# Altium footprint library idc.PcbLib: 45 footprints (part 3 of 3)
Each footprint in its own frame and in the unit in brackets; x right, y up, seen from the top. Pads: shape width x height; smd on the part's side, far side on the other; paste and mask are expansions set on the pad; w line width, h text height; cw(c..) or ccw(c..) is an arc to the next point about the centre after c.
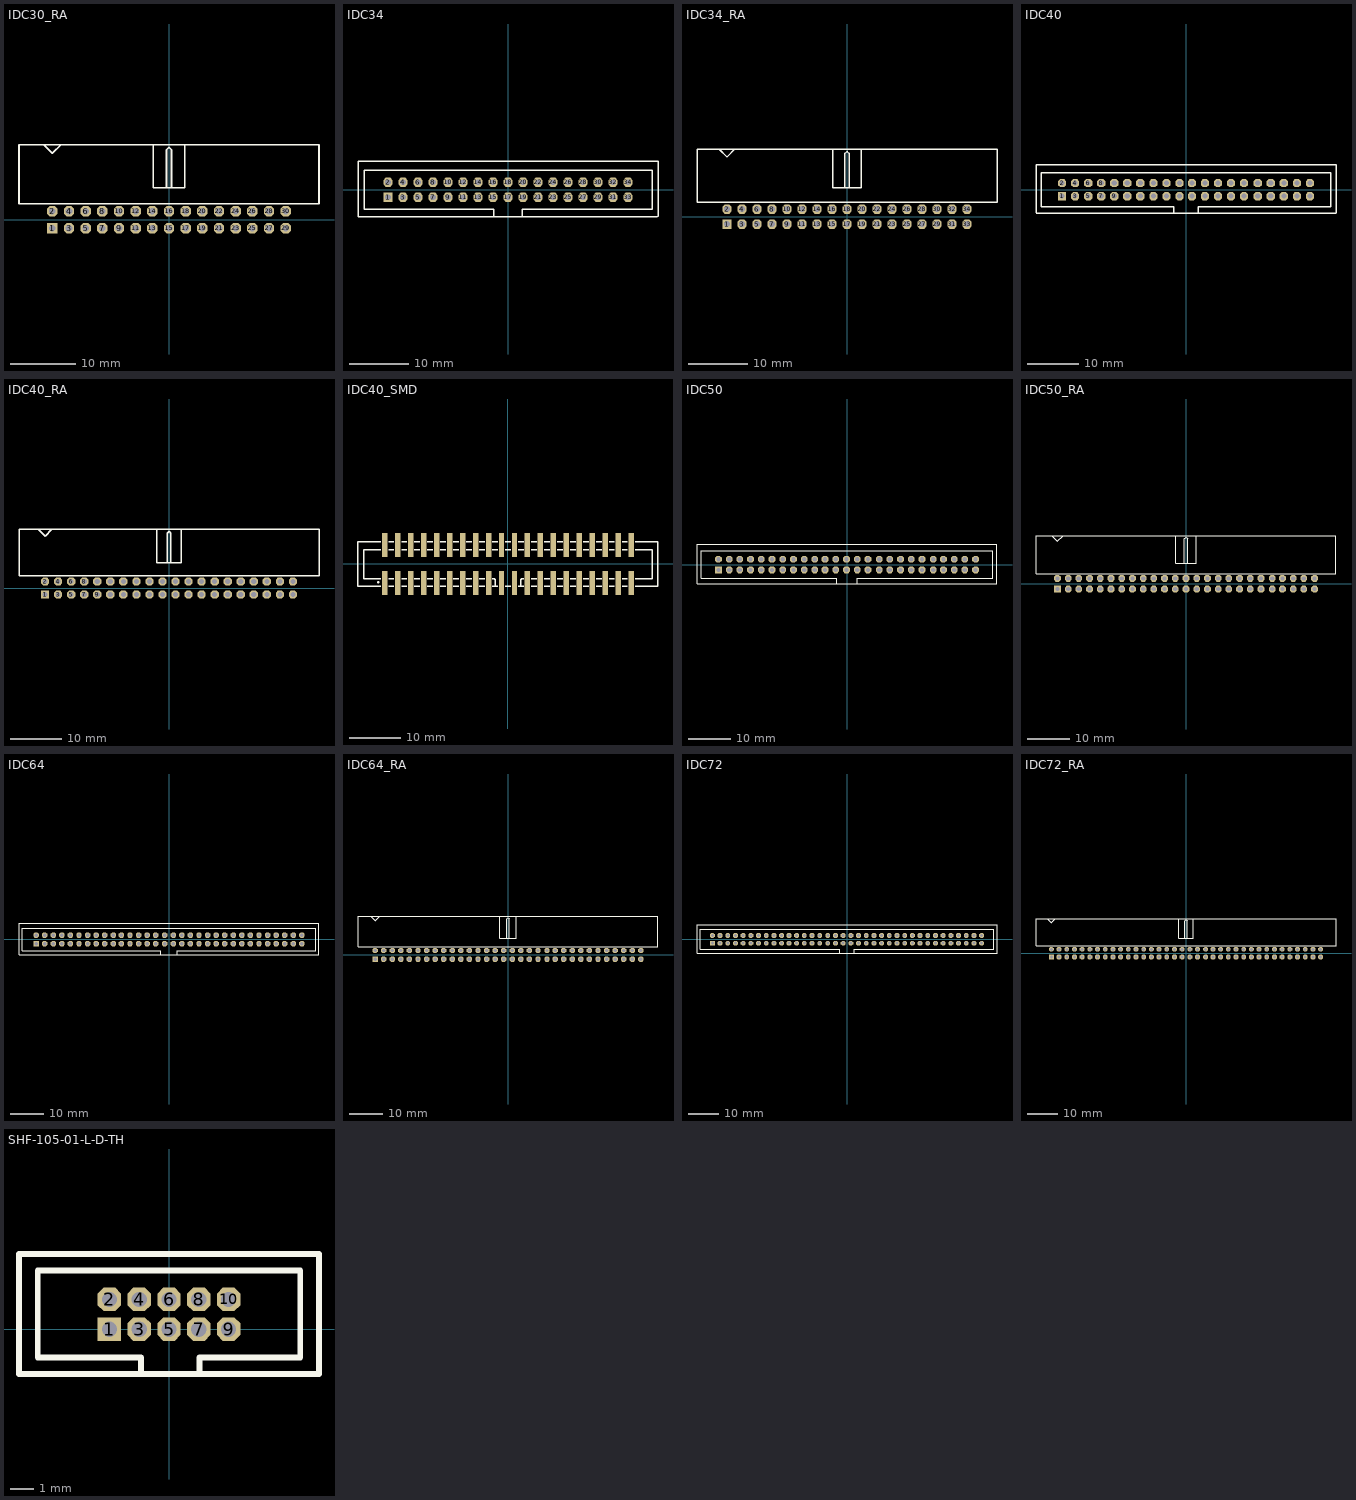
[diagram p2: the footprints below, top view; thin cyan lines are the x and y axes]

## IDC30_RA [mm] "2.54mm, 30 Pin IDC Male Connector, Right Angle"
height 9.45
pads (30):
  rect 1.6x1.6 hole 1: 1(-17.78,-1.27)
  oct 1.6x1.6 hole 1: 2(-17.78,1.27) 3(-15.24,-1.27) 4(-15.24,1.27) 5(-12.7,-1.27) 6(-12.7,1.27) 7(-10.16,-1.27) 8(-10.16,1.27) 9(-7.62,-1.27) 10(-7.62,1.27) 11(-5.08,-1.27) 12(-5.08,1.27) 13(-2.54,-1.27) 14(-2.54,1.27) 15(0,-1.27) 16(0,1.27) 17(2.54,-1.27) 18(2.54,1.27) 19(5.08,-1.27) 20(5.08,1.27) 21(7.62,-1.27) 22(7.62,1.27) 23(10.16,-1.27) 24(10.16,1.27) 25(12.7,-1.27) 26(12.7,1.27) 27(15.24,-1.27) 28(15.24,1.27) 29(17.78,-1.27) 30(17.78,1.27)
Top Overlay:
  lines w0.254: -19.088,11.417 -17.78,10.109 -16.459,11.43 ; -2.413,11.43 -2.413,4.877 2.413,4.877 ; -0.381,4.877 -0.381,10.668 0,11.049 0.381,10.668 0.381,4.877 ; 2.413,4.928 2.413,11.43 ; -22.86,2.413 22.86,2.413 22.86,11.43 -22.86,11.43 -22.86,2.413
3D body "Samtec-HTST-115-01-G-D-RA.step": height 9.46, standoff -3.24, extent -22.86,-1.524 22.86,11.43

## IDC34 [mm] "2.54mm, 34 Pin IDC Male Connector"
height 9.45
pads (34):
  rect 1.6x1.6 hole 1: 1(-20.32,-1.27)
  oct 1.6x1.6 hole 1: 2(-20.32,1.27) 3(-17.78,-1.27) 4(-17.78,1.27) 5(-15.24,-1.27) 6(-15.24,1.27) 7(-12.7,-1.27) 8(-12.7,1.27) 9(-10.16,-1.27) 10(-10.16,1.27) 11(-7.62,-1.27) 12(-7.62,1.27) 13(-5.08,-1.27) 14(-5.08,1.27) 15(-2.54,-1.27) 16(-2.54,1.27) 17(0,-1.27) 18(0,1.27) 19(2.54,-1.27) 20(2.54,1.27) 21(5.08,-1.27) 22(5.08,1.27) 23(7.62,-1.27) 24(7.62,1.27) 25(10.16,-1.27) 26(10.16,1.27) 27(12.7,-1.27) 28(12.7,1.27) 29(15.24,-1.27) 30(15.24,1.27) 31(17.78,-1.27) 32(17.78,1.27) 33(20.32,-1.27) 34(20.32,1.27)
Top Overlay:
  lines w0.254: -25.4,-4.572 25.273,-4.572 ; -25.4,-4.5 -25.4,4.826 25.4,4.826 25.4,-4.5 ; -2.413,-4.5 -2.413,-3.302 -24.384,-3.302 -24.384,3.302 24.384,3.302 24.384,-3.302 2.413,-3.302 2.413,-4.5
3D body "Samtec-HTST-117-01-G-D.step": height 9.29, standoff -2.9, extent -25.4,-4.762 25.4,4.636

## IDC34_RA [mm] "2.54mm, 34 Pin IDC Male Connector, Right Angle"
height 9.45
pads (34):
  rect 1.6x1.6 hole 1: 1(-20.32,-1.27)
  oct 1.6x1.6 hole 1: 2(-20.32,1.27) 3(-17.78,-1.27) 4(-17.78,1.27) 5(-15.24,-1.27) 6(-15.24,1.27) 7(-12.7,-1.27) 8(-12.7,1.27) 9(-10.16,-1.27) 10(-10.16,1.27) 11(-7.62,-1.27) 12(-7.62,1.27) 13(-5.08,-1.27) 14(-5.08,1.27) 15(-2.54,-1.27) 16(-2.54,1.27) 17(0,-1.27) 18(0,1.27) 19(2.54,-1.27) 20(2.54,1.27) 21(5.08,-1.27) 22(5.08,1.27) 23(7.62,-1.27) 24(7.62,1.27) 25(10.16,-1.27) 26(10.16,1.27) 27(12.7,-1.27) 28(12.7,1.27) 29(15.24,-1.27) 30(15.24,1.27) 31(17.78,-1.27) 32(17.78,1.27) 33(20.32,-1.27) 34(20.32,1.27)
Top Overlay:
  lines w0.254: -21.628,11.417 -20.32,10.109 -18.999,11.43 ; -2.413,11.43 -2.413,4.877 2.413,4.877 ; -0.381,4.877 -0.381,10.668 0,11.049 0.381,10.668 0.381,4.877 ; 2.413,4.928 2.413,11.43 ; -25.4,2.413 -25.4,11.43 25.4,11.43 25.4,2.413 -25.4,2.413
3D body "Samtec-HTST-117-01-G-D-RA.step": height 9.46, standoff -3.24, extent -25.4,-1.524 25.4,11.43

## IDC40 [mm] "2.54mm, 40 Pin IDC Male Connector"
height 9.45
pads (40):
  rect 1.6x1.6 hole 1: 1(-24.13,-1.27)
  oct 1.6x1.6 hole 1: 2(-24.13,1.27) 3(-21.59,-1.27) 4(-21.59,1.27) 5(-19.05,-1.27) 6(-19.05,1.27) 7(-16.51,-1.27) 8(-16.51,1.27) 9(-13.97,-1.27) 10(-13.97,1.27) 11(-11.43,-1.27) 12(-11.43,1.27) 13(-8.89,-1.27) 14(-8.89,1.27) 15(-6.35,-1.27) 16(-6.35,1.27) 17(-3.81,-1.27) 18(-3.81,1.27) 19(-1.27,-1.27) 20(-1.27,1.27) 21(1.143,-1.27) 22(1.143,1.27) 23(3.683,-1.27) 24(3.683,1.27) 25(6.223,-1.27) 26(6.223,1.27) 27(8.763,-1.27) 28(8.763,1.27) 29(11.303,-1.27) 30(11.303,1.27) 31(13.97,-1.27) 32(13.97,1.27) 33(16.51,-1.27) 34(16.51,1.27) 35(19.05,-1.27) 36(19.05,1.27) 37(21.59,-1.27) 38(21.59,1.27) 39(24.13,-1.27) 40(24.13,1.27)
Top Overlay:
  lines w0.254: -29.21,-4.572 29.21,-4.572 ; -29.21,-4.5 -29.21,4.826 29.21,4.826 29.21,-4.5 ; -2.413,-4.5 -2.413,-3.302 -28.194,-3.302 -28.194,3.302 28.194,3.302 28.194,-3.302 2.413,-3.302 2.413,-4.5
3D body "Samtec-HTST-120-01-G-D.STEP": height 9.27, standoff -2.92, extent -29.21,-4.648 29.21,4.826

## IDC40_RA [mm] "2.54mm, 40 Pin IDC Male Connector, Right Angle"
height 9.45
pads (40):
  rect 1.6x1.6 hole 1: 1(-24.13,-1.27)
  oct 1.6x1.6 hole 1: 2(-24.13,1.27) 3(-21.59,-1.27) 4(-21.59,1.27) 5(-19.05,-1.27) 6(-19.05,1.27) 7(-16.51,-1.27) 8(-16.51,1.27) 9(-13.97,-1.27) 10(-13.97,1.27) 11(-11.43,-1.27) 12(-11.43,1.27) 13(-8.89,-1.27) 14(-8.89,1.27) 15(-6.35,-1.27) 16(-6.35,1.27) 17(-3.81,-1.27) 18(-3.81,1.27) 19(-1.27,-1.27) 20(-1.27,1.27) 21(1.27,-1.27) 22(1.27,1.27) 23(3.81,-1.27) 24(3.81,1.27) 25(6.35,-1.27) 26(6.35,1.27) 27(8.89,-1.27) 28(8.89,1.27) 29(11.43,-1.27) 30(11.43,1.27) 31(13.97,-1.27) 32(13.97,1.27) 33(16.51,-1.27) 34(16.51,1.27) 35(19.05,-1.27) 36(19.05,1.27) 37(21.59,-1.27) 38(21.59,1.27) 39(24.13,-1.27) 40(24.13,1.27)
Top Overlay:
  lines w0.254: -25.438,11.417 -24.13,10.109 -22.809,11.43 ; -2.413,11.43 -2.413,4.877 2.413,4.877 ; -0.381,4.877 -0.381,10.668 0,11.049 0.381,10.668 0.381,4.877 ; 2.413,4.928 2.413,11.43 ; -29.21,2.413 -29.21,11.43 29.21,11.43 29.21,2.413 -29.21,2.413
3D body "Samtec-HTST-120-01-G-D-RA.step": height 9.46, standoff -3.24, extent -29.21,-1.524 29.21,11.43

## IDC40_SMD [mm] "2.54mm, 40 Pin IDC Male Connector, SMD"
height 9.7
pads (40):
  rect 1.07x4.7 smd: 1(-24.13,-3.746) 2(-24.13,3.746) 3(-21.59,-3.746) 4(-21.59,3.746) 5(-19.05,-3.746) 6(-19.05,3.746) 7(-16.51,-3.746) 8(-16.51,3.746) 9(-13.97,-3.746) 10(-13.97,3.746) 11(-11.43,-3.746) 12(-11.43,3.746) 13(-8.89,-3.746) 14(-8.89,3.746) 15(-6.35,-3.746) 16(-6.35,3.746) 17(-3.81,-3.746) 18(-3.81,3.746) 19(-1.27,-3.746) 20(-1.27,3.746) 21(1.27,-3.746) 22(1.27,3.746) 23(3.81,-3.746) 24(3.81,3.746) 25(6.35,-3.746) 26(6.35,3.746) 27(8.89,-3.746) 28(8.89,3.746) 29(11.43,-3.746) 30(11.43,3.746) 31(13.97,-3.746) 32(13.97,3.746) 33(16.51,-3.746) 34(16.51,3.746) 35(19.05,-3.746) 36(19.05,3.746) 37(21.59,-3.746) 38(21.59,3.746) 39(24.13,-3.746) 40(24.13,3.746)
Top Overlay:
  circle w0.254: c-25.4,-3.556 r0.127
  lines w0.254: -24.892,-4.318 -29.337,-4.318 -29.337,4.318 -24.892,4.318 ; -24.892,-2.921 -28.194,-2.921 -28.194,2.794 -24.892,2.794 ; -23.368,-4.318 -22.352,-4.318 ; -23.368,-2.921 -22.352,-2.921 ; -23.368,2.794 -22.352,2.794 ; -23.368,4.318 -22.352,4.318 ; -20.828,-4.318 -19.812,-4.318 ; -20.828,-2.921 -19.812,-2.921 ; -20.828,2.794 -19.812,2.794 ; -20.828,4.318 -19.812,4.318 ; -18.288,-4.318 -17.272,-4.318 ; -18.288,-2.921 -17.272,-2.921 ; -18.288,2.794 -17.272,2.794 ; -18.288,4.318 -17.272,4.318 ; -15.748,-4.318 -14.732,-4.318 ; -15.748,-2.921 -14.732,-2.921 ; -15.748,2.794 -14.732,2.794 ; -15.748,4.318 -14.732,4.318 ; -13.208,-4.318 -12.192,-4.318 ; -13.208,-2.921 -12.192,-2.921 ; -13.208,2.794 -12.192,2.794 ; -13.208,4.318 -12.192,4.318 ; -10.668,-4.318 -9.652,-4.318 ; -10.668,-2.921 -9.652,-2.921 ; -10.668,2.794 -9.652,2.794 ; -10.668,4.318 -9.652,4.318 ; -8.128,-4.318 -7.112,-4.318 ; -8.128,-2.921 -7.112,-2.921 ; -8.128,2.794 -7.112,2.794 ; -8.128,4.318 -7.112,4.318 ; -5.588,-4.318 -4.572,-4.318 ; -5.588,-2.921 -4.572,-2.921 ; -5.588,2.794 -4.572,2.794 ; -5.588,4.318 -4.572,4.318 ; -3.048,-4.318 -2.032,-4.318 ; -3.048,-2.921 -2.667,-2.921 -2.54,-3.048 -2.54,-4.246 ; -3.048,2.794 -2.032,2.794 ; -3.048,4.318 -2.032,4.318 ; -0.508,-4.318 0.508,-4.318 ; -0.508,2.794 0.508,2.794 ; -0.508,4.318 0.508,4.318 ; 2.032,-4.318 3.048,-4.318 ; 2.032,2.794 3.048,2.794 ; 2.032,4.318 3.048,4.318 ; 2.54,-4.246 2.54,-3.048 2.667,-2.921 3.048,-2.921 ; 4.572,-4.318 5.588,-4.318 ; 4.572,-2.921 5.588,-2.921 ; 4.572,2.794 5.588,2.794 ; 4.572,4.318 5.588,4.318 ; 7.112,-4.318 8.128,-4.318 ; 7.112,-2.921 8.128,-2.921 ; 7.112,2.794 8.128,2.794 ; 7.112,4.318 8.128,4.318 ; 9.652,-4.318 10.668,-4.318 ; 9.652,-2.921 10.668,-2.921 ; 9.652,2.794 10.668,2.794 ; 9.652,4.318 10.668,4.318 ; 12.192,-4.318 13.208,-4.318 ; 12.192,-2.921 13.208,-2.921 ; 12.192,2.794 13.208,2.794 ; 12.192,4.318 13.208,4.318 ; 14.732,-4.318 15.748,-4.318 ; 14.732,-2.921 15.748,-2.921 ; 14.732,2.794 15.748,2.794 ; 14.732,4.318 15.748,4.318 ; 17.272,-4.318 18.288,-4.318 ; 17.272,-2.921 18.288,-2.921 ; 17.272,2.794 18.288,2.794 ; 17.272,4.318 18.288,4.318 ; 19.812,-4.318 20.828,-4.318 ; 19.812,-2.921 20.828,-2.921 ; 19.812,2.794 20.828,2.794 ; 19.812,4.318 20.828,4.318 ; 22.352,-4.318 23.368,-4.318 ; 22.352,-2.921 23.368,-2.921 ; 22.352,2.794 23.368,2.794 ; 22.352,4.318 23.368,4.318 ; 24.892,-4.318 29.337,-4.318 29.337,4.318 24.892,4.318 ; 24.892,-2.921 28.194,-2.921 28.194,2.794 24.892,2.794
3D body "HTST-120-01-T-DV.stp": height 10.14, standoff -0.02, extent -29.21,-5.588 29.21,5.588

## IDC50 [mm] "2.54mm, 50 Pin IDC Male Connector"
height 9.45
pads (50):
  rect 1.6x1.6 hole 1: 1(-30.48,-1.27)
  oct 1.6x1.6 hole 1: 2(-30.48,1.27) 3(-27.94,-1.27) 4(-27.94,1.27) 5(-25.4,-1.27) 6(-25.4,1.27) 7(-22.86,-1.27) 8(-22.86,1.27) 9(-20.32,-1.27) 10(-20.32,1.27) 11(-17.78,-1.27) 12(-17.78,1.27) 13(-15.24,-1.27) 14(-15.24,1.27) 15(-12.7,-1.27) 16(-12.7,1.27) 17(-10.16,-1.27) 18(-10.16,1.27) 19(-7.62,-1.27) 20(-7.62,1.27) 21(-5.207,-1.27) 22(-5.207,1.27) 23(-2.667,-1.27) 24(-2.667,1.27) 25(-0.127,-1.27) 26(-0.127,1.27) 27(2.413,-1.27) 28(2.413,1.27) 29(4.953,-1.27) 30(4.953,1.27) 31(7.62,-1.27) 32(7.62,1.27) 33(10.16,-1.27) 34(10.16,1.27) 35(12.7,-1.27) 36(12.7,1.27) 37(15.24,-1.27) 38(15.24,1.27) 39(17.78,-1.27) 40(17.78,1.27) 41(20.447,-1.27) 42(20.447,1.27) 43(22.86,-1.27) 44(22.86,1.27) 45(25.4,-1.27) 46(25.4,1.27) 47(27.94,-1.27) 48(27.94,1.27) 49(30.48,-1.27) 50(30.48,1.27)
Top Overlay:
  lines w0.254: -35.56,-4.572 35.56,-4.572 ; -35.56,-4.5 -35.56,4.826 35.56,4.826 35.56,-4.5 ; -2.413,-4.5 -2.413,-3.302 -34.544,-3.302 -34.544,3.302 34.544,3.302 34.544,-3.302 2.413,-3.302 2.413,-4.5
3D body "Samtec-HTST-125-01-G-D.step": height 9.29, standoff -2.9, extent -35.56,-4.648 35.56,4.75

## IDC50_RA [mm] "2.54mm, 50 Pin IDC Male Connector, Right Angle"
height 9.45
pads (50):
  rect 1.6x1.6 hole 1: 1(-30.48,-1.27)
  oct 1.6x1.6 hole 1: 2(-30.48,1.27) 3(-27.94,-1.27) 4(-27.94,1.27) 5(-25.4,-1.27) 6(-25.4,1.27) 7(-22.86,-1.27) 8(-22.86,1.27) 9(-20.32,-1.27) 10(-20.32,1.27) 11(-17.78,-1.27) 12(-17.78,1.27) 13(-15.24,-1.27) 14(-15.24,1.27) 15(-12.7,-1.27) 16(-12.7,1.27) 17(-10.16,-1.27) 18(-10.16,1.27) 19(-7.62,-1.27) 20(-7.62,1.27) 21(-5.08,-1.27) 22(-5.08,1.27) 23(-2.54,-1.27) 24(-2.54,1.27) 25(0,-1.27) 26(0,1.27) 27(2.54,-1.27) 28(2.54,1.27) 29(5.08,-1.27) 30(5.08,1.27) 31(7.62,-1.27) 32(7.62,1.27) 33(10.16,-1.27) 34(10.16,1.27) 35(12.7,-1.27) 36(12.7,1.27) 37(15.24,-1.27) 38(15.24,1.27) 39(17.78,-1.27) 40(17.78,1.27) 41(20.447,-1.27) 42(20.447,1.27) 43(22.86,-1.27) 44(22.86,1.27) 45(25.4,-1.27) 46(25.4,1.27) 47(27.94,-1.27) 48(27.94,1.27) 49(30.48,-1.27) 50(30.48,1.27)
Top Overlay:
  lines w0.254: -31.788,11.417 -30.48,10.109 -29.159,11.43 ; -2.413,11.43 -2.413,4.877 2.413,4.877 ; -0.381,4.877 -0.381,10.668 0,11.049 0.381,10.668 0.381,4.877 ; 2.413,4.928 2.413,11.43 ; -35.56,2.413 35.56,2.413 35.56,11.43 -35.56,11.43 -35.56,2.413
3D body "Samtec-HTST-125-01-G-D-RA.step": height 9.46, standoff -3.24, extent -35.56,-1.524 35.56,11.43

## IDC64 [mm] "2.54mm, 64 Pin IDC Male Connector"
height 9.45
pads (64):
  rect 1.6x1.6 hole 1: 1(-39.37,-1.27)
  oct 1.6x1.6 hole 1: 2(-39.37,1.27) 3(-36.83,-1.27) 4(-36.83,1.27) 5(-34.29,-1.27) 6(-34.29,1.27) 7(-31.75,-1.27) 8(-31.75,1.27) 9(-29.21,-1.27) 10(-29.21,1.27) 11(-26.67,-1.27) 12(-26.67,1.27) 13(-24.13,-1.27) 14(-24.13,1.27) 15(-21.59,-1.27) 16(-21.59,1.27) 17(-19.05,-1.27) 18(-19.05,1.27) 19(-16.51,-1.27) 20(-16.51,1.27) 21(-14.097,-1.27) 22(-14.097,1.27) 23(-11.557,-1.27) 24(-11.557,1.27) 25(-9.017,-1.27) 26(-9.017,1.27) 27(-6.477,-1.27) 28(-6.477,1.27) 29(-3.937,-1.27) 30(-3.937,1.27) 31(-1.27,-1.27) 32(-1.27,1.27) 33(1.27,-1.27) 34(1.27,1.27) 35(3.81,-1.27) 36(3.81,1.27) 37(6.35,-1.27) 38(6.35,1.27) 39(8.89,-1.27) 40(8.89,1.27) 41(11.43,-1.27) 42(11.43,1.27) 43(13.97,-1.27) 44(13.97,1.27) 45(16.51,-1.27) 46(16.51,1.27) 47(19.05,-1.27) 48(19.05,1.27) 49(21.59,-1.27) 50(21.59,1.27) 51(24.13,-1.27) 52(24.13,1.27) 53(26.67,-1.27) 54(26.67,1.27) 55(29.21,-1.27) 56(29.21,1.27) 57(31.75,-1.27) 58(31.75,1.27) 59(34.29,-1.27) 60(34.29,1.27) 61(36.83,-1.27) 62(36.83,1.27) 63(39.37,-1.27) 64(39.37,1.27)
Top Overlay:
  lines w0.254: -44.45,-4.572 44.45,-4.572 ; -44.45,-4.5 -44.45,4.826 44.45,4.826 44.45,-4.5 ; -2.413,-4.5 -2.413,-3.302 -43.434,-3.302 -43.434,3.302 43.434,3.302 43.434,-3.302 2.413,-3.302 2.413,-4.5
3D body "Samtec-HTST-132-01-G-D.step": height 9.29, standoff -2.9, extent -44.45,-4.648 44.45,4.75

## IDC64_RA [mm] "2.54mm, 64 Pin IDC Male Connector, Right Angle"
height 9.45
pads (64):
  rect 1.6x1.6 hole 1: 1(-39.37,-1.27)
  oct 1.6x1.6 hole 1: 2(-39.37,1.27) 3(-36.83,-1.27) 4(-36.83,1.27) 5(-34.29,-1.27) 6(-34.29,1.27) 7(-31.75,-1.27) 8(-31.75,1.27) 9(-29.21,-1.27) 10(-29.21,1.27) 11(-26.67,-1.27) 12(-26.67,1.27) 13(-24.13,-1.27) 14(-24.13,1.27) 15(-21.59,-1.27) 16(-21.59,1.27) 17(-19.05,-1.27) 18(-19.05,1.27) 19(-16.51,-1.27) 20(-16.51,1.27) 21(-13.97,-1.27) 22(-13.97,1.27) 23(-11.43,-1.27) 24(-11.43,1.27) 25(-8.89,-1.27) 26(-8.89,1.27) 27(-6.35,-1.27) 28(-6.35,1.27) 29(-3.81,-1.27) 30(-3.81,1.27) 31(-1.27,-1.27) 32(-1.27,1.27) 33(1.27,-1.27) 34(1.27,1.27) 35(3.81,-1.27) 36(3.81,1.27) 37(6.35,-1.27) 38(6.35,1.27) 39(8.89,-1.27) 40(8.89,1.27) 41(11.557,-1.27) 42(11.557,1.27) 43(13.97,-1.27) 44(13.97,1.27) 45(16.51,-1.27) 46(16.51,1.27) 47(19.05,-1.27) 48(19.05,1.27) 49(21.59,-1.27) 50(21.59,1.27) 51(24.13,-1.27) 52(24.13,1.27) 53(26.67,-1.27) 54(26.67,1.27) 55(29.21,-1.27) 56(29.21,1.27) 57(31.75,-1.27) 58(31.75,1.27) 59(34.29,-1.27) 60(34.29,1.27) 61(36.83,-1.27) 62(36.83,1.27) 63(39.37,-1.27) 64(39.37,1.27)
Top Overlay:
  lines w0.254: -40.678,11.417 -39.37,10.109 -38.049,11.43 ; -2.413,11.43 -2.413,4.877 2.413,4.877 ; -0.381,4.877 -0.381,10.668 0,11.049 0.381,10.668 0.381,4.877 ; 2.413,4.928 2.413,11.43 ; -44.45,2.413 44.45,2.413 44.45,11.43 -44.45,11.43 -44.45,2.413
3D body "Samtec-HTST-132-01-G-D-RA.step": height 9.46, standoff -3.24, extent -44.45,-1.524 44.45,11.43

## IDC72 [mm] "2.54mm, 72 Pin IDC Male Connector"
height 9.45
pads (72):
  rect 1.6x1.6 hole 1: 1(-44.45,-1.27)
  oct 1.6x1.6 hole 1: 2(-44.45,1.27) 3(-41.91,-1.27) 4(-41.91,1.27) 5(-39.37,-1.27) 6(-39.37,1.27) 7(-36.83,-1.27) 8(-36.83,1.27) 9(-34.29,-1.27) 10(-34.29,1.27) 11(-31.75,-1.27) 12(-31.75,1.27) 13(-29.21,-1.27) 14(-29.21,1.27) 15(-26.67,-1.27) 16(-26.67,1.27) 17(-24.13,-1.27) 18(-24.13,1.27) 19(-21.59,-1.27) 20(-21.59,1.27) 21(-19.177,-1.27) 22(-19.177,1.27) 23(-16.637,-1.27) 24(-16.637,1.27) 25(-14.097,-1.27) 26(-14.097,1.27) 27(-11.557,-1.27) 28(-11.557,1.27) 29(-9.017,-1.27) 30(-9.017,1.27) 31(-6.35,-1.27) 32(-6.35,1.27) 33(-3.81,-1.27) 34(-3.81,1.27) 35(-1.27,-1.27) 36(-1.27,1.27) 37(1.27,-1.27) 38(1.27,1.27) 39(3.81,-1.27) 40(3.81,1.27) 41(6.35,-1.27) 42(6.35,1.27) 43(8.89,-1.27) 44(8.89,1.27) 45(11.43,-1.27) 46(11.43,1.27) 47(13.97,-1.27) 48(13.97,1.27) 49(16.51,-1.27) 50(16.51,1.27) 51(19.05,-1.27) 52(19.05,1.27) 53(21.59,-1.27) 54(21.59,1.27) 55(24.13,-1.27) 56(24.13,1.27) 57(26.67,-1.27) 58(26.67,1.27) 59(29.21,-1.27) 60(29.21,1.27) 61(31.75,-1.27) 62(31.75,1.27) 63(34.29,-1.27) 64(34.29,1.27) 65(36.83,-1.27) 66(36.83,1.27) 67(39.37,-1.27) 68(39.37,1.27) 69(41.91,-1.27) 70(41.91,1.27) 71(44.45,-1.27) 72(44.45,1.27)
Top Overlay:
  lines w0.254: -49.53,-4.572 49.53,-4.572 ; -49.53,-4.5 -49.53,4.826 49.53,4.826 49.53,-4.5 ; -2.413,-4.5 -2.413,-3.302 -48.514,-3.302 -48.514,3.302 48.514,3.302 48.514,-3.302 2.413,-3.302 2.413,-4.5
3D body "Samtec-HTST-136-01-G-D.step": height 9.29, standoff -2.9, extent -49.53,-4.648 49.53,4.75

## IDC72_RA [mm] "2.54mm, 72 Pin IDC Male Connector, Right Angle"
height 9.45
pads (72):
  rect 1.6x1.6 hole 1: 1(-44.45,-1.27)
  oct 1.6x1.6 hole 1: 2(-44.45,1.27) 3(-41.91,-1.27) 4(-41.91,1.27) 5(-39.37,-1.27) 6(-39.37,1.27) 7(-36.83,-1.27) 8(-36.83,1.27) 9(-34.29,-1.27) 10(-34.29,1.27) 11(-31.75,-1.27) 12(-31.75,1.27) 13(-29.21,-1.27) 14(-29.21,1.27) 15(-26.67,-1.27) 16(-26.67,1.27) 17(-24.13,-1.27) 18(-24.13,1.27) 19(-21.59,-1.27) 20(-21.59,1.27) 21(-19.05,-1.27) 22(-19.05,1.27) 23(-16.51,-1.27) 24(-16.51,1.27) 25(-13.97,-1.27) 26(-13.97,1.27) 27(-11.43,-1.27) 28(-11.43,1.27) 29(-8.89,-1.27) 30(-8.89,1.27) 31(-6.35,-1.27) 32(-6.35,1.27) 33(-3.81,-1.27) 34(-3.81,1.27) 35(-1.27,-1.27) 36(-1.27,1.27) 37(1.27,-1.27) 38(1.27,1.27) 39(3.81,-1.27) 40(3.81,1.27) 41(6.477,-1.27) 42(6.477,1.27) 43(8.89,-1.27) 44(8.89,1.27) 45(11.43,-1.27) 46(11.43,1.27) 47(13.97,-1.27) 48(13.97,1.27) 49(16.51,-1.27) 50(16.51,1.27) 51(19.05,-1.27) 52(19.05,1.27) 53(21.59,-1.27) 54(21.59,1.27) 55(24.13,-1.27) 56(24.13,1.27) 57(26.67,-1.27) 58(26.67,1.27) 59(29.21,-1.27) 60(29.21,1.27) 61(31.75,-1.27) 62(31.75,1.27) 63(34.29,-1.27) 64(34.29,1.27) 65(36.83,-1.27) 66(36.83,1.27) 67(39.37,-1.27) 68(39.37,1.27) 69(41.91,-1.27) 70(41.91,1.27) 71(44.45,-1.27) 72(44.45,1.27)
Top Overlay:
  lines w0.254: -45.758,11.417 -44.45,10.109 -43.129,11.43 ; -2.413,11.43 -2.413,4.877 2.413,4.877 ; -0.381,4.877 -0.381,10.668 0,11.049 0.381,10.668 0.381,4.877 ; 2.413,4.928 2.413,11.43 ; -49.53,2.413 -49.53,11.43 49.53,11.43 49.53,2.413 -49.53,2.413
3D body "Samtec-HTST-136-01-G-D-RA.step": height 9.46, standoff -3.24, extent -49.53,-1.524 49.53,11.43

## SHF-105-01-L-D-TH [mm] "1,27mm, 10 Pin Male Connector"
height 5.33
pads (10):
  rect 1x1 hole 0.65: 1(-2.54,0)
  oct 1x1 hole 0.65: 2(-2.54,1.27) 3(-1.27,0) 4(-1.27,1.27) 5(0,0) 6(0,1.27) 7(1.27,0) 8(1.27,1.27) 9(2.54,0) 10(2.54,1.27)
Top Overlay:
  lines w0.254: -1.2,-1.9 -1.2,-1.2 -5.6,-1.2 -5.6,2.5 5.6,2.5 5.6,-1.2 1.3,-1.2 1.3,-1.8 ; -6.4,-1.905 6.4,-1.905 6.4,3.2 -6.4,3.2 -6.4,-1.905
3D body "SHF-105-01-L-D-TH.stp": height 5.38, standoff -1.86, extent -6.35,-1.905 6.35,3.683